# Altium schematic symbol library lib_datalogger.SchLib: 1246 symbols (part 6 of 16) (continued)
## CMP-008-000028-2 (continued)
LED GREEN CLEAR 3MM ROUND T/H; Manufacturer: Lumex Opto/Components Inc; MSRP: 0,32984; Number of LEDs: 1; Wavelength: 574nm; Luminous Intensity: 1000mcd; Lens Color: Colorless; eVendor: Digi-Key; Forward Current: 20mA; eVendor#: 67-2183-ND; Viewing Angle: 30°; Forward Voltage: 2.2V; eVendorPrice: 1,12; Lens Style: Dome,Diffused,Colorless,Round; Source: mits.SchLib; Mount: Through Hole; Series: -; Illumination Color: Green; Design Item ID: LED T-3 GRN 3MM 574NM WATER CLR 2LD; Obs: --; Part#: SSL-LX3044SUGC; Max Operating Temperature: 85°C; Height: 4.6mm; Packaging: Bulk; Min Operating Temperature: -40°C; Case/Package: Radial; MOQ: 10000; Datasheet: http://www.lumex.com/specs/SSL-LX3044SUGC.pdf; Color: Green; RoHS Compliant: Yes; Lens Transparency: Clear; Package Quantity: 1000; Test Current: 20mA; Number of Pins: 2
footprint LED-3mm-VERDE
footprint LED-3mm-VERDE
pins: A, K

## CMP-008-000029-1
designator D?, comment TVS DIODE 5.0SMDJ12CA 12VWM 19.9VC SMD
TVS DIODE 12VWM 19.9VC SMD; Manufacturer: Littelfuse Inc.; Current - Peak Pulse (10/1000µs): 252A; Power Line Protection: No; Type: Zener; Voltage - Clamping (Max) @ Ipp: 19.9V; Voltage - Reverse Standoff (Typ): 12V; Power - Peak Pulse: 5000W (5kW); Voltage - Breakdown (Min): 13.3V; Capacitance @ Frequency: -; ComponentLink1Description: http://www.littelfuse.com/products/tvs-diodes/surface-mount/~/media/electronics/datasheets/tvs_diodes/littelfuse_tvs_diode_5_0smdj_datasheet.pdf.pdf; ComponentLink1URL: http://www.littelfuse.com/products/tvs-diodes/surface-mount/~/media/electronics/datasheets/tvs_diodes/littelfuse_tvs_diode_5_0smdj_datasheet.pdf.pdf; Design Item ID: TVS DIODE 5.0SMDJ12CA 12VWM 19.9VC SMD; Packaging: Cut Tape (CT); Operating Temperature: -55°C ~ 150°C (TJ); Applications: General Purpose; Manufacturer Part Number: 5.0SMDJ12CA; Package / Case: DO-214AB, SMC; Supplier Device Package: DO-214AB (SMCJ); Part Status: Active; Mounting Type: Surface Mount; Source: mits.SchLib; RoHS: RoHS Compliant; Pricing 1: 1=1.85, 10=1.673, 25=1.4936, 100=1.3442, 250=1.1948, 500=1.04546, 1000=0.86623 (USD); Stock 1: 196; Category: Circuit Protection
footprint DO-214AB(SMC)
footprint DO-214AB(SMC)
pins: 1, 2

## CMP-008-000030-1
designator D?, comment TVS DIODE 5.0SMDJ28A 28VWM 45.4VC SMD
TVS DIODE 28VWM 45.4VC SMD; Manufacturer: Littelfuse Inc.; Voltage - Breakdown (Min): 31.1V; Current - Peak Pulse (10/1000µs): 110A; Type: Zener; Power - Peak Pulse: 5000W (5kW); Power Line Protection: No; Voltage - Reverse Standoff (Typ): 28V; Voltage - Clamping (Max) @ Ipp: 45.4V; Packaging: Cut Tape (CT); Part Status: Active; Operating Temperature: -55°C ~ 150°C (TJ); Source: mits.SchLib; Applications: General Purpose; Mounting Type: Surface Mount; ComponentLink1URL: http://www.littelfuse.com/products/tvs-diodes/surface-mount/~/media/electronics/datasheets/tvs_diodes/littelfuse_tvs_diode_5_0smdj_datasheet.pdf.pdf; Design Item ID: TVS DIODE 5.0SMDJ28A 28VWM 45.4VC SMD; Supplier Device Package: DO-214AB (SMCJ); Stock 1: 2911; Pricing 1: 1=1.72, 10=1.552, 25=1.3852, 100=1.2468, 250=1.10828, 500=0.96974, 1000=0.8035 (USD); Capacitance @ Frequency: -; Package / Case: DO-214AB, SMC; ComponentLink1Description: http://www.littelfuse.com/products/tvs-diodes/surface-mount/~/media/electronics/datasheets/tvs_diodes/littelfuse_tvs_diode_5_0smdj_datasheet.pdf.pdf; RoHS: RoHS Compliant; Manufacturer Part Number: 5.0SMDJ28A; Category: Circuit Protection
footprint DO-214AB(SMC)
footprint DO-214AB(SMC)
pins: 1 K, 2 A

## CMP-008-000031-1
designator D?, comment TVS DIODE 56VWLDP01-56AY M 76VC D2PAK SMD
TVS DIODE 56VWM 76VC D2PAK; Manufacturer: STMicroelectronics; Unidirectional Channels: 1; Power Line Protection: No; Voltage - Breakdown (Min): 53.3V; Current - Peak Pulse (10/1000µs): 48A; Voltage - Reverse Standoff (Typ): 48V; Voltage - Clamping (Max) @ Ipp: 76V; Type: Zener; Mounting Type: Surface Mount; Category: Circuit Protection; Stock 1: 1369; Power - Peak Pulse: -; Operating Temperature: -55°C ~ 175°C (TJ); ComponentLink1URL: http://www.st.com/web/en/resource/technical/document/datasheet/DM00122355.pdf; RoHS: RoHS Compliant; Part Status: Active; Design Item ID: TVS DIODE 56VWLDP01-56AY M 76VC D2PAK SMD; Package / Case: TO-263-3, D²Pak (2 Leads + Tab), TO-263AB; Bidirectional Channels: -; Capacitance @ Frequency: -; Source: mits.SchLib; Applications: Automotive; Packaging: Cut Tape (CT); Manufacturer Part Number: LDP01-56AY; Pricing 1: 1=2.52, 10=2.26, 100=1.8133, 500=1.4904 (USD); Supplier Device Package: D2PAK; ComponentLink1Description: http://www.st.com/web/en/resource/technical/document/datasheet/DM00122355.pdf
footprint TO263-3 (D²Pak (2 Leads + Tab))
footprint TO263-3 (D²Pak (2 Leads + Tab))
pins: 1 A, 2 K, 3 A

## CMP-008-000032-1
designator R?, comment TVS DIODE 5KP16CA 16VWM 26VC AXIAL TH
TVS DIODE 16VWM 26VC AXIAL; Manufacturer: Littelfuse Inc; eVendorPrice: 3,07; MSRP: 1,97968; eVendor#: 5KP16CALFCT-ND; eVendor: Digi-Key; Observações: --; Datasheet: http://www.littelfuse.com/~/media/electronics/datasheets/tvs_diodes/littelfuse_tvs_diode_5kp_datasheet.pdf.pdf; MOQ: 250; Design Item ID: TVS DIODE 5KP16CA 16VWM 26VC AXIAL TH; Part#: 5KP16CA; Source: mits.SchLib
footprint CR1608-0603 (Chip Resistor; Body 1.6 x 0.8 mm (LxW typ))
footprint R-6
pins: 1, 2
text: 1%

## CMP-008-000033-1
designator D?, comment TVS DIODE 5KP24A 24VWM 38.9VC AXIAL TH
TVS DIODE 24VWM 38.9VC AXIAL; Manufacturer: Littelfuse Inc; eVendor: Digi-Key; MSRP: 1,80044; Observações: Uni-directional; eVendor#: 5KP24ALFCT-ND; eVendorPrice: 2,79; Source: mits.SchLib; Design Item ID: TVS DIODE 5KP24A 24VWM 38.9VC AXIAL TH; MOQ: 250; Part#: 5KP24A; Datasheet: http://www.littelfuse.com/~/media/electronics/datasheets/tvs_diodes/littelfuse_tvs_diode_5kp_datasheet.pdf.pdf
footprint R-6
footprint R-6
pins: 1 K, 2 A

## CMP-008-000034-1
designator D?, comment TVS DIODE 5KP40CA 40VWM 64.5VC AXIAL TH
TVS DIODE 40VWM 64.5VC AXIAL TH; Manufacturer: Littelfuse Inc; eVendor#: 5KP40CALFTR-ND; MSRP: 1,97968; eVendor: Digi-Key; eVendorPrice: 3,07; Part#: 5KP40CA; MOQ: 250; Datasheet: http://www.littelfuse.com/~/media/electronics/datasheets/tvs_diodes/littelfuse_tvs_diode_5kp_datasheet.pdf.pdf; Design Item ID: TVS DIODE 5KP40CA 40VWM 64.5VC AXIAL TH; Observações: --; Source: mits.SchLib
footprint DO-214AB(SMC)
footprint R-6
pins: 1, 2

## CMP-008-000035-2
designator D?, comment ATV50C400JB-HF
Automotive Tvs Diode 40VWM 64.5VC DO214AB Smc; Manufacturer: Comchip Technology; Peak Pulse Power: 5kW; Peak Pulse Current: 77.5A; Number of Bidirectional Channels: 1; Clamping Voltage: 64.5V; Reverse Standoff Voltage: 40V; Power Line Protection: No; Min Breakdown Voltage: 44.4V; MSRP: 1,03555; eVendor: Digi-Key; eVendorPrice: 2,22; eVendor#: 641-1605-1-ND; MOQ: 1000; RoHS Compliant: Yes; Datasheet: http://www.comchiptech.com/cms/UserFiles/ATV50C-HF%20Series%20RevA.pdf; Source: mits.SchLib; Design Item ID: TVS DIODE ATV50C400JB-HF 40VWM 64.5VC SMC; Packaging: Tape and Reel; Package Quantity: 3000; Case/Package: SMC; Resistor Type: Zener; Observações: --; Max Operating Temperature: 150°C; Mount: Surface Mount; Min Operating Temperature: -55°C; Part#: ATV50C400JB-HF
footprint DO-214AB(SMC)
footprint DO-214AB(SMC)
pins: 1, 2

## CMP-008-000036-1
designator U?, comment TVS DIODE CM1216-08MR 3.3VWM 9VC 10MSOP
TVS DIODE 3.3VWM 9VC 10MSOP; Manufacturer: ON Semiconductor; Voltage - Reverse Standoff (Typ): 3.3V; Voltage - Breakdown (Min): 6V; Power Line Protection: Yes; Current - Peak Pulse (10/1000µs): 1A (8/20µs); Unidirectional Channels: 8; Voltage - Clamping (Max) @ Ipp: 9V (Typ); Applications: General Purpose; Stock 1: 3587; Design Item ID: TVS DIODE CM1216-08MR 3.3VWM 9VC 10MSOP; Power - Peak Pulse: -; Category: Circuit Protection; Operating Temperature: -40°C ~ 125°C (TJ); Bidirectional Channels: -; ComponentLink1Description: http://www.onsemi.com/pub_link/Collateral/CM1216-D.PDF; Mounting Type: Surface Mount; Package / Case: 10-TFSOP, 10-MSOP (0.118", 3.00mm Width); Source: mits.SchLib; RoHS: RoHS Compliant; Packaging: Cut Tape (CT); Type: Steering (Rail to Rail); Manufacturer Part Number: CM1216-08MR; Capacitance @ Frequency: -; Part Status: Active; Supplier Device Package: 10-MSOP; Pricing 1: 1=1.22, 10=1.094, 100=0.8526, 500=0.70434, 1000=0.55605 (USD); ComponentLink1URL: http://www.onsemi.com/pub_link/Collateral/CM1216-D.PDF
footprint TSSOP10
footprint TSSOP10
pins: 1 I/O 1, 2 I/O 2, 3 I/O 3, 4 I/O 4, 5 GND (power), 6 I/O 5, 7 I/O 6, 8 VCC, 9 I/O 7, 10 I/O 8

## CMP-008-000037-1
designator U?, comment TVS DIODE PRTR5V0U2X,215 5.5VWM SOT143B_1
TVS DIODE 5.5VWM SOT143B; Manufacturer: NXP Semiconductors; MSRP: 0,20265; eVendorPrice: 0,57; eVendor#: 568-4140-1-ND; eVendor: Digi-Key; Design Item ID: TVS DIODE PRTR5V0U2X,215 5.5VWM SOT143B_1; Datasheet: http://www.nxp.com/documents/data_sheet/PRTR5V0U2X.pdf; MOQ: 1000; Source: mits.SchLib; Part#: PRTR5V0U2X,215
footprint SOT143B
footprint SOT143B
pins: 1 GND (power), 2 I/O 1 (io), 3 I/O 2 (io), 4 VCC (power)

## CMP-008-000038-1
designator U?, comment TVS DIODE PRTR5V0U8S,118 5.5VWM 10TSSOP SMD
TVS DIODE 5.5VWM 10TSSOP; Manufacturer: NXP USA Inc.; Voltage - Breakdown (Min): 6V; Voltage - Reverse Standoff (Typ): 5.5V (Max); Capacitance @ Frequency: 1pF @ 1MHz; Power Line Protection: Yes; Unidirectional Channels: 8; Power - Peak Pulse: -; Source: mits.SchLib; Package / Case: 10-TFSOP, 10-MSOP (0.118", 3.00mm Width); ComponentLink1URL: http://www.nxp.com/documents/data_sheet/PRTR5V0U8S.pdf; Mounting Type: Surface Mount; RoHS: RoHS Compliant; Supplier Device Package: 10-TSSOP; Stock 1: 0; Category: Circuit Protection; Voltage - Clamping (Max) @ Ipp: -; Design Item ID: TVS DIODE PRTR5V0U8S,118 5.5VWM 10TSSOP SMD; Packaging: Cut Tape (CT); Bidirectional Channels: -; Manufacturer Part Number: PRTR5V0U8S,118; Part Status: Obsolete; Pricing 1: 1=0 (USD); Applications: General Purpose; Type: Steering (Rail to Rail); Operating Temperature: -40°C ~ 85°C (TA); Current - Peak Pulse (10/1000µs): -; ComponentLink1Description: http://www.nxp.com/documents/data_sheet/PRTR5V0U8S.pdf
footprint TSSOP10
footprint TSSOP10
pins: 1 I/O 1, 2 I/O 2, 3 GND, 4 I/O 3, 5 I/O 4, 6 I/O 5, 7 I/O 6, 8 VCC, 9 I/O 7, 10 I/O 8

## CMP-008-000039-1
designator D?, comment TVS DIODE SACB12 12VWM 19VC SMD
TVS DIODE 12VWM 19VC SMD; Manufacturer: Littelfuse Inc; eVendorPrice: 0,72; MSRP: 0,25725; eVendor: Digi-Key; eVendor#: SACB12CT-ND; Source: mits.SchLib; MOQ: 1000; Observações: --; Datasheet: http://www.littelfuse.com/~/media/electronics/datasheets/tvs_diodes/littelfuse_tvs_diode_sacb_datasheet.pdf.pdf; Design Item ID: TVS DIODE SACB12 12VWM 19VC SMD; Part#: SACB12
footprint DO-214AA(SMB)
footprint DO-214AA(SMB)-6
pins: 1 K, 2 A

## CMP-008-000040-1
designator U?, comment TVS DIODE SLVU2.8 2.8VWM 15VC 8SOIC
TVS DIODE 2.8VWM 15VC 8SOIC; Manufacturer Part Number: SLVU2.8-4BTG; Manufacturer: Littelfuse Inc.; Power Line Protection: No; Current - Peak Pulse (10/1000µs): 40A (8/20µs); Voltage - Reverse Standoff (Typ): 2.8V (Max); Voltage - Breakdown (Min): 3V; Power - Peak Pulse: 600W; Voltage - Clamping (Max) @ Ipp: 15V; Capacitance @ Frequency: 2pF @ 1MHz; Pricing 1: 1=1.98, 10=1.788, 25=1.5964, 100=1.4369, 250=1.2772, 500=1.11756, 1000=0.92597 (USD); Type: Zener; Supplier Device Package: 8-SOIC; ComponentLink1URL: http://www.littelfuse.com/~/media/electronics/datasheets/tvs_diode_arrays/littelfuse_tvs_diode_array_slvu2_8_4_datasheet.pdf.pdf; Part Status: Active; Packaging: Cut Tape (CT); Operating Temperature: -40°C ~ 125°C (TJ); RoHS: RoHS Compliant; Mounting Type: Surface Mount; Source: mits.SchLib; Applications: General Purpose; ComponentLink1Description: http://www.littelfuse.com/~/media/electronics/datasheets/tvs_diode_arrays/littelfuse_tvs_diode_array_slvu2_8_4_datasheet.pdf.pdf; Stock 1: 7453; Design Item ID: TVS DIODE SLVU2.8 2.8VWM 15VC 8SOIC; Package / Case: 8-SOIC (0.154", 3.90mm Width); Category: Circuit Protection
footprint SOIC-8
footprint SOIC-8
pins: 1 (io), 2 (io), 3 (io), 4 (io), 5 (io), 6 (io), 7 (io), 8 (io)

## CMP-008-000041-2
designator D?, comment TVS DIODE SLVU2.8 2.8VWM 15VC SOT23
TVS DIODE 2.8VWM 15VC SOT23; Manufacturer: Littelfuse Inc; Part#: SLVU2.8HTG; eVendorPrice: 1,08; eVendor#: F4207CT-ND; MSRP: 0,465; eVendor: Digi-Key; MOQ: 1000; Source: mits.SchLib; Datasheet: http://www.littelfuse.com/~/media/electronics/datasheets/tvs_diode_arrays/littelfuse_tvs_diode_array_slvu2_8_datasheet.pdf.pdf; Observações: --; Design Item ID: TVS DIODE SLVU2.8 2.8VWM 15VC SOT23
footprint SOT-23
footprint SOT-23
pins: 1, 2, 3

## CMP-008-000042-1
designator D?, comment TVS DIODE SM2T3V3A 3.3VWM 6.8VC DO216AA SMD
TVS DIODE 3.3VWM 6.8VC DO216AA; Manufacturer: STMicroelectronics; Type: Zener; Power - Peak Pulse: 200W; Capacitance @ Frequency: 2500pF @ 1MHz; Voltage - Breakdown (Min): 3.6V; Voltage - Reverse Standoff (Typ): 3.3V; Unidirectional Channels: 1; Voltage - Clamping (Max) @ Ipp: 6.8V; Power Line Protection: No; Current - Peak Pulse (10/1000µs): 30A; ComponentLink1URL: http://www.st.com/web/en/resource/technical/document/datasheet/CD00070945.pdf; Pricing 1: 1=0.61, 10=0.537, 100=0.4108, 500=0.32548, 1000=0.2607 (USD); Package / Case: DO-216AA; Operating Temperature: -; Stock 1: 29699; Supplier Device Package: DO-216AA; Manufacturer Part Number: SM2T3V3A; Category: Circuit Protection; Design Item ID: TVS DIODE SM2T3V3A 3.3VWM 6.8VC DO216AA SMD; Bidirectional Channels: -; RoHS: RoHS Compliant; Packaging: Cut Tape (CT); ComponentLink1Description: http://www.st.com/web/en/resource/technical/document/datasheet/CD00070945.pdf; Source: mits.SchLib; Applications: General Purpose; Mounting Type: Surface Mount
footprint DO-216AA
footprint DO-216AA
pins: 1 A, 2 K

## CMP-008-000043-1
designator D?, comment TVS DIODE SMBJ12CA 12VWM 19.9VC SMB SMD
TVS DIODE 12VWM 19.9VC SMB; Manufacturer: Micro Commercial Co; Manufacturer Part Number: SMBJ12CA-TP; Voltage - Clamping (Max) @ Ipp: 19.9V; Type: Zener; Power - Peak Pulse: 600W; Power Line Protection: No; Current - Peak Pulse (10/1000µs): 30.2A; Voltage - Reverse Standoff (Typ): 12V; Voltage - Breakdown (Min): 13.3V; Capacitance @ Frequency: -; Applications: General Purpose; Part Status: Active; ComponentLink1URL: http://www.mccsemi.com/up_pdf/SMBJ5.0-SMBJ440CA(DO-214AA).pdf; Operating Temperature: -55°C ~ 175°C (TJ); ComponentLink1Description: http://www.mccsemi.com/up_pdf/SMBJ5.0-SMBJ440CA(DO-214AA).pdf; Packaging: Cut Tape (CT); Stock 1: 2379; Category: Circuit Protection; Supplier Device Package: DO-214AA (SMB); Design Item ID: TVS DIODE SMBJ12CA 12VWM 19.9VC SMB SMD; Mounting Type: Surface Mount; RoHS: RoHS Compliant; Package / Case: DO-214AA, SMB; Source: mits.SchLib; Pricing 1: 1=0.54, 10=0.38, 25=0.3116, 100=0.2493, 250=0.18128, 500=0.1473, 1000=0.1133 (USD)
footprint DO-214AA(SMB)
footprint DO-214AA(SMB)-6
pins: 1 A, 2 K

## CMP-008-000044-1
designator D?, comment TVS DIODE SMBJ15A 15VWM 24.4VC SMB
TVS DIODE 15VWM 24.4VC SMB; Manufacturer: Vishay Semiconductor Diodes Division; Manufacturer Part Number: SMBJ15A-E3/52; Power Line Protection: No; Current - Peak Pulse (10/1000µs): 24.6A; Unidirectional Channels: 1; Voltage - Reverse Standoff (Typ): 15V; Voltage - Breakdown (Min): 16.7V; Power - Peak Pulse: 600W; Type: Zener; Voltage - Clamping (Max) @ Ipp: 24.4V; Source: mits.SchLib; Applications: General Purpose; Supplier Device Package: DO-214AA (SMBJ); Packaging: Cut Tape (CT); Category: Circuit Protection; Operating Temperature: -55°C ~ 150°C (TJ); Bidirectional Channels: -; Stock 1: 0; Package / Case: DO-214AA, SMB; RoHS: RoHS Compliant; Mounting Type: Surface Mount; Pricing 1: 1=0.44, 10=0.333, 100=0.2078 (USD); ComponentLink1URL: http://www.vishay.com/docs/88392/smbj50a.pdf; Capacitance @ Frequency: -; Design Item ID: TVS DIODE SMBJ15A 15VWM 24.4VC SMB; ComponentLink1Description: http://www.vishay.com/docs/88392/smbj50a.pdf
footprint DO-214AA(SMB)
footprint DO-214AA(SMB)-6
pins: 1 A, 2 K

## CMP-008-000045-1
designator D?, comment TVS DIODE SMBJ15CA 15VWM 24.4VC SMB SMD
TVS DIODE 15VWM 24.4VC SMB; Manufacturer Part Number: SMBJ15CA-E3/52; Manufacturer: Vishay Semiconductor Diodes Division; Power Line Protection: No; Voltage - Breakdown (Min): 16.7V; Voltage - Reverse Standoff (Typ): 15V; Type: Zener; Current - Peak Pulse (10/1000µs): 24.6A; Power - Peak Pulse: 600W; Voltage - Clamping (Max) @ Ipp: 24.4V; ComponentLink1URL: http://www.vishay.com/docs/88392/smbj50a.pdf; Stock 1: 3382; Part Status: Active; Mounting Type: Surface Mount; Source: mits.SchLib; Applications: General Purpose; Category: Circuit Protection; Package / Case: DO-214AA, SMB; Operating Temperature: -55°C ~ 150°C (TJ); Supplier Device Package: DO-214AA (SMBJ); Pricing 1: 1=0.41, 10=0.329, 25=0.3012, 100=0.2241, 250=0.20312 (USD); RoHS: RoHS Compliant; Design Item ID: TVS DIODE SMBJ15CA 15VWM 24.4VC SMB SMD; Packaging: Cut Tape (CT); Capacitance @ Frequency: -; ComponentLink1Description: http://www.vishay.com/docs/88392/smbj50a.pdf
footprint DO-214AA(SMB)
footprint DO-214AA(SMB)-6
pins: 1 A, 2 K

## CMP-008-000046-1
designator D?, comment TVS DIODE SMBJ20A 20VWM 32.4VC SMB
TVS DIODE 20V 32.4V DO214AA; Manufacturer: Littelfuse; Power Dissipation: 600W; Peak Pulse Current: 18.6A; Polarity: Unidirectional; Diode Type: ZENER; Number of Channels: 1; Max Breakdown Voltage: 24.5V; Breakdown Voltage: 22.2V; Power Line Protection: No; Test Current: 1mA; Leakage Current: 1uA; ComponentLink3Description: https://datasheet.ciiva.com/331/littelfuse-tvs-diode-smbj-datasheet-pdf-331294.pdf?src-supplier=Digi-Key; Voltage Rating (DC): 20V; Reverse Standoff Voltage: 20V; Max Operating Temperature: 150°C; Resistor Type: Zener; Max Surge Current: 18.6A; Category: TVS Diodes; Number of Elements: 1; ComponentLink2Description: https://datasheet.ciiva.com/331/littelfuse-tvs-diode-smbj-datasheet-pdf-331293.pdf?src-supplier=Digi-Key; Mount: Surface Mount; Max Power Dissipation: 600W; Number of Pins: 2; Case/Package: DO-214AA; ComponentLink4Description: https://datasheet.ciiva.com/331/littelfuse-tvs-diode-smbj-datasheet-pdf-331295.pdf?src-supplier=Digi-Key; RoHS Compliant: Yes; ComponentLink1Description: http://www.vishay.com/docs/88392/smbj50a.pdf; Design Item ID: TVS DIODE SMBJ20A 20VWM 32.4VC SMB; Operating Supply Voltage: 20V; Lead Free: Lead Free; ComponentLink2URL: https://datasheet.ciiva.com/331/littelfuse-tvs-diode-smbj-datasheet-pdf-331293.pdf?src-supplier=Digi-Key; Min Breakdown Voltage: 22.2V; ComponentLink3URL: https://datasheet.ciiva.com/331/littelfuse-tvs-diode-smbj-datasheet-pdf-331294.pdf?src-supplier=Digi-Key; Package Quantity: 3000; Height: 2.44mm; Stock 1: 45; Width: 3.94mm; Manufacturer Part Number: SMBJ20A; RoHS: Yes; Pricing 1: 5=0,15360, 50=0,11800, 150=0,11150, 500=0,10500, 2500=0,10210, 5000=0,10060, 5=0,14700, 50=0,11290, 150=0,10680, 500=0,10050, 2500=0,09770, 5000=0,09630, 5=0,76770, 50=0,58980, 150=0,55760, 500=0,52470, 2500=0,51030, 5000=0,50310, 5=0,73940, 50=0,56800, 150=0,53700, 500=0,50540, 2500=0,49150, 5000=0,48450, 5=0,09940, 50=0,07640, 150=0,07220, 500=0,06790, 2500=0,06610, 5000=0,06510, 5=0,08450, 50=0,06490, 150=0,06140, 500=0,05780, 2500=0,05620, 5000=0,05540, 5=0,90900, 50=0,69830, 150=0,66020, 500=0,62130, 2500=0,60420, 5000=0,59560, 5=12,94150, 50=9,94140, 150=9,39890, 500=8,84540, 2500=8,60180, 5000=8,48000, 5=0,48400, 50=0,37180, 150=0,35150, 500=0,33080, 2500=0,32170, 5000=0,31720, 5=8,93530, 50=6,86390, 150=6,48940, 500=6,10720, 2500=5,93910, 5000=5,85500, 5=1,01980, 50=0,78340, 150=0,74060, 500=0,69700, 2500=0,67780, 5000=0,66820, 5=0,15730, 50=0,12080, 150=0,11420, 500=0,10750, 2500=0,10460, 5000=0,10310, 5=0,11690, 50=0,08980, 150=0,08490, 500=0,07990, 2500=0,07770, 5000=0,07660 (AUD); Clamping Voltage-Max: 32.4V; Series: SMBJ; ComponentLink5Description: https://datasheet.ciiva.com/4509/littelfuse-tvs-diode-smbj-48653-4509407.pdf?src-supplier=Mouser; ComponentLink7Description: https://datasheet.ciiva.com/46381/607623-46381901.pdf?src-supplier=Element14; Length: 5.59mm; REACH SVHC: No SVHC; ComponentLink6Description: https://datasheet.ciiva.com/16391/littelfuse-tvs-diode-smbj-16391319.pdf?src-supplier=Future+Electronics; ComponentLink1URL: http://www.vishay.com/docs/88392/smbj50a.pdf; Reverse Breakdown Voltage: 22.2V; Packaging: Tape and Reel; Radiation Hardening: No; Peak Pulse Power: 600W; ComponentLink5URL: https://datasheet.ciiva.com/4509/littelfuse-tvs-diode-smbj-48653-4509407.pdf?src-supplier=Mouser; Clamping Voltage: 32.4V; Termination: SMD/SMT; ComponentLink4URL: https://datasheet.ciiva.com/331/littelfuse-tvs-diode-smbj-datasheet-pdf-331295.pdf?src-supplier=Digi-Key; Min Operating Temperature: -55°C; Number of Unidirectional Channels: 1; ComponentLink7URL: https://datasheet.ciiva.com/46381/607623-46381901.pdf?src-supplier=Element14; Source: mits.SchLib; ComponentLink6URL: https://datasheet.ciiva.com/16391/littelfuse-tvs-diode-smbj-16391319.pdf?src-supplier=Future+Electronics; Direction: Unidirectional
footprint DO-214AA(SMB)
footprint DO-214AA(SMB)-6
pins: 1 A, 2 K

## CMP-008-000047-1
designator D?, comment TVS DIODE SMBJP6KE6.8CA 5.8VWM 10.5VC SMBJ SMD
TVS DIODE 5.8VWM 10.5VC SMBJ; Manufacturer: Micro Commercial Co; Manufacturer Part Number: SMBJP6KE6.8CA-TP; Current - Peak Pulse (10/1000µs): 58.1A; Power - Peak Pulse: 600W; Power Line Protection: No; Voltage - Breakdown (Min): 6.45V; Voltage - Reverse Standoff (Typ): 5.8V; Type: Zener; Voltage - Clamping (Max) @ Ipp: 10.5V; Operating Temperature: -55°C ~ 175°C (TJ); ComponentLink1Description: http://www.mccsemi.com/up_pdf/SMBJP6KE6.8(C)A-SMBJP6KE550(C)A(DO-214AA).pdf; Package / Case: DO-214AA, SMB; Packaging: Cut Tape (CT); Applications: General Purpose; ComponentLink1URL: http://www.mccsemi.com/up_pdf/SMBJP6KE6.8(C)A-SMBJP6KE550(C)A(DO-214AA).pdf; Stock 1: 18765; Pricing 1: 1=0.44, 10=0.341, 25=0.288, 100=0.2343, 250=0.19416, 500=0.16068, 1000=0.12051 (USD); Source: mits.SchLib; Supplier Device Package: DO-214AA (SMBJ); Capacitance @ Frequency: -; RoHS: RoHS Compliant; Part Status: Active; Category: Circuit Protection; Design Item ID: TVS DIODE SMBJP6KE6.8CA 5.8VWM 10.5VC SMBJ SMD; Mounting Type: Surface Mount
footprint DO-214AA(SMB)
footprint DO-214AA(SMB)-6
pins: 1 A, 2 K

## CMP-008-000048-1
designator D?, comment TVS DIODE SMCJ1.5KE20A-TP 17.1VWM 27.7VC SMC SMD
TVS DIODE 17.1VWM 27.7VC SMC; Manufacturer: Micro Commercial Co; Power Line Protection: No; Power - Peak Pulse: 1500W (1.5kW); Voltage - Breakdown (Min): 19V; Current - Peak Pulse (10/1000µs): 54.9A; Voltage - Clamping (Max) @ Ipp: 27.7V; Type: Zener; Voltage - Reverse Standoff (Typ): 17.1V; Unidirectional Channels: 1; RoHS: RoHS Compliant; Capacitance @ Frequency: -; Bidirectional Channels: -; Manufacturer Part Number: SMCJ1.5KE20A-TP; Part Status: Active; Design Item ID: TVS DIODE SMCJ1.5KE20A-TP 17.1VWM 27.7VC SMC SMD; Category: Circuit Protection; ComponentLink1Description: http://www.mccsemi.com/up_pdf/SMCJ1.5KE6.8(C)A-SMCJ1.5KE550(C)A(DO-214AB).pdf; Applications: General Purpose; Package / Case: DO-214AB, SMC; ComponentLink1URL: http://www.mccsemi.com/up_pdf/SMCJ1.5KE6.8(C)A-SMCJ1.5KE550(C)A(DO-214AB).pdf; Operating Temperature: -55°C ~ 175°C (TJ); Pricing 1: 1=0.68, 10=0.569, 25=0.4976, 100=0.4264, 250=0.36956, 500=0.3127, 1000=0.24164 (USD); Packaging: Cut Tape (CT); Stock 1: 8753; Supplier Device Package: DO-214AB, (SMC); Source: mits.SchLib; Mounting Type: Surface Mount
footprint DO-214AB(SMC) / R-6
footprint DO-214AB(SMC)
footprint DO-214AB(SMC)
footprint DO-214AB(SMC) %2F R-6
pins: 1 K, 2 A

## CMP-008-000049-1
designator U?, comment TVS DIODE SP3304N 3.3VWM 11.5VC UDFN10
TVS DIODE 3.3VWM 11.5VC UDFN10; Manufacturer Part Number: SP3304NUTG; Manufacturer: Littelfuse Inc.; Power Line Protection: Yes; Voltage - Reverse Standoff (Typ): 3.3V (Max); Voltage - Clamping (Max) @ Ipp: 11.5V; Current - Peak Pulse (10/1000µs): 20A (8/20µs); Power - Peak Pulse: 300W; Package / Case: 10-UFDFN Exposed Pad; Source: mits.SchLib; Capacitance @ Frequency: -; Operating Temperature: -40°C ~ 125°C (TJ); Pricing 1: 1=1.69, 10=1.501, 25=1.3556, 100=1.186, 250=1.0408, 500=0.9198, 1000=0.72615 (USD); RoHS: RoHS Compliant; Design Item ID: TVS DIODE SP3304N 3.3VWM 11.5VC UDFN10; Type: Steering (Rail to Rail); ComponentLink1URL: http://www.littelfuse.com/~/media/electronics/datasheets/tvs_diode_arrays/littelfuse_tvs_diode_array_sp3304n_datasheet.pdf.pdf; ComponentLink1Description: http://www.littelfuse.com/~/media/electronics/datasheets/tvs_diode_arrays/littelfuse_tvs_diode_array_sp3304n_datasheet.pdf.pdf; Voltage - Breakdown (Min): -; Stock 1: 2111; Part Status: Active; Category: Circuit Protection; Applications: Ethernet; Supplier Device Package: 10-uDFN (2.6x2.6); Mounting Type: Surface Mount; Packaging: Cut Tape (CT)
footprint 10-UDFN
footprint 10-UDFN
pins: 1 I/O1 (io), 3 I/O2 (io), 5 NC, 7 I/O3 (io), 9 I/O4 (io), E GND (power)

## CMP-008-000050-1
designator U?, comment TVS DIODE SRDA05-6 5VWM 20VC 8SOIC_1
TVS DIODE 5VWM 20VC 8SOIC; Manufacturer: Semtech Corporation; Manufacturer Part Number: SRDA05-6.TBT; Voltage - Reverse Standoff (Typ): 5V (Max); Voltage - Clamping (Max) @ Ipp: 20V; Power - Peak Pulse: 500W; Voltage - Breakdown (Min): 6V; Power Line Protection: Yes; Current - Peak Pulse (10/1000µs): 25A (8/20µs); Capacitance @ Frequency: 8pF @ 1MHz; Packaging: Cut Tape (CT); Package / Case: 8-SOIC (0.154", 3.90mm Width); Mounting Type: Surface Mount; Supplier Device Package: 8-SO; Design Item ID: TVS DIODE SRDA05-6 5VWM 20VC 8SOIC_1; Category: Circuit Protection; Pricing 1: 1=3, 10=2.678, 25=2.4096, 100=2.1956, 250=1.98136 (USD); Applications: General Purpose; ComponentLink1Description: http://www.semtech.com/images/datasheet/srda-6.pdf; ComponentLink1URL: http://www.semtech.com/images/datasheet/srda-6.pdf; Stock 1: 1121; Source: mits.SchLib; Operating Temperature: -55°C ~ 125°C (TJ); Type: Steering (Rail to Rail); RoHS: RoHS Compliant; Part Status: Active
footprint SOIC-8
footprint SOIC-8
pins: 1 I/O1 (io), 2 I/O2 (io), 3 VREF, 4 I/O3 (io), 5 I/O4 (io), 6 I/O5 (io), 7 I/O6 (io), 8 GND (power)

## CMP-008-000051-1
designator U?, comment TVS DIODE SRDA05-6 5VWM 20VC 8SOIC
TVS DIODE 5VWM 20VC 8SOIC; Manufacturer: Semtech Corporation; Manufacturer Part Number: SRDA05-6.TBT; Voltage - Breakdown (Min): 6V; Power - Peak Pulse: 500W; Power Line Protection: Yes; Capacitance @ Frequency: 8pF @ 1MHz; Current - Peak Pulse (10/1000µs): 25A (8/20µs); Voltage - Clamping (Max) @ Ipp: 20V; Voltage - Reverse Standoff (Typ): 5V (Max); Applications: General Purpose; Category: Circuit Protection; Operating Temperature: -55°C ~ 125°C (TJ); Stock 1: 1121; Supplier Device Package: 8-SO; Type: Steering (Rail to Rail); Part Status: Active; ComponentLink1URL: http://www.semtech.com/images/datasheet/srda-6.pdf; Source: mits.SchLib; Pricing 1: 1=3, 10=2.678, 25=2.4096, 100=2.1956, 250=1.98136 (USD); Mounting Type: Surface Mount; Design Item ID: TVS DIODE SRDA05-6 5VWM 20VC 8SOIC; ComponentLink1Description: http://www.semtech.com/images/datasheet/srda-6.pdf; Packaging: Cut Tape (CT); RoHS: RoHS Compliant; Package / Case: 8-SOIC (0.154", 3.90mm Width)
footprint SOIC-8
footprint SOIC-8
pins: 1 I/O1 (io), 2 I/O2 (io), 3 VREF, 4 I/O3 (io), 5 I/O4 (io), 6 I/O5 (io), 7 I/O6 (io), 8 GND (power)

## CMP-008-000052-1
designator U?, comment TVS DIODE TVS3V3L4U 3.3VWM 7.7VC SC74
TVS DIODE 3.3VWM 7.7VC SC74; Manufacturer Part Number: GS1M-LTP; Manufacturer: Infineon Technologies; Part#: TVS3V3L4U E6327; Voltage - DC Reverse (Vr) (Max): 1000V (1kV); Diode Type: Standard; Voltage - Forward (Vf) (Max) @ If: 1V @ 1A; eVendor#: TVS3V3L4U E6327CT-ND; Current - Average Rectified (Io): 1A; Speed: Standard Recovery >500ns, > 200mA (Io); Current - Reverse Leakage @ Vr: 10µA @ 1000V; eVendor: Digi-Key; Capacitance @ Vr, F: 15pF @ 4V, 1MHz; eVendorPrice: 0,90; MSRP: 0,35871; Pricing 1: 1=0.28, 10=0.258, 25=0.1856, 100=0.1442, 250=0.0906, 500=0.0772, 1000=0.0526, 2500=0.0474 (USD); Mounting Type: Surface Mount; Datasheet: http://www.infineon.com/dgdl/TVS3V3L4U_rev_2_2.pdf?folderId=db3a30431f848401011fcbf2ab4c04c4&fileId=db3a3043382e837301385be7912532ed; Design Item ID: TVS DIODE TVS3V3L4U 3.3VWM 7.7VC SC74; Category: Discrete Semiconductor Products; Reverse Recovery Time (trr): -; Source: mits.SchLib; RoHS: RoHS Compliant; ComponentLink1Description: http://www.mccsemi.com/up_pdf/GS1A-L~GS1M-L(DO-214AC).pdf; Operating Temperature - Junction: -55°C ~ 150°C; Package / Case: DO-214AC, SMA; Supplier Device Package: DO-214AC (SMA); Packaging: Cut Tape (CT); MOQ: 1000; Observações: -; Stock 1: 49379; ComponentLink1URL: http://www.mccsemi.com/up_pdf/GS1A-L~GS1M-L(DO-214AC).pdf
footprint SC74, SOT-457
footprint SC74, SOT-457
pins: 1 I/O1 (io), 2 GND (power), 3 I/O2 (io), 4 I/O3 (io), 5 NC, 6 I/O4 (io)

## CMP-008-000053-1
designator D?, comment TVS DIODE VESD05B1-02VHG3-08 5VWM 9.5VC SOD523
ESD Suppressor TVS Uni-Directional 30kV Automotive 2-Pin SOD-523 T/R; Manufacturer: Vishay; Source: mits.SchLib; Pricing 1: 1=0,40000, 10=0,29900, 100=0,16940, 500=0,11220, 1000=0,08602, 2000=0,07480 (USD); Manufacturer Part Number: VESD05B1-02VHG3-08; RoHS: No; Category: TVS Diodes; Design Item ID: TVS DIODE VESD05B1-02VHG3-08 5VWM 9.5VC SOD523
footprint SOD-523
footprint SOD-523
pins: 1 A, 2 K

## CMP-009-000000-1
designator FL?, comment MLPF-WB55-01E3
Filter; Manufacturer 1: STMicroelectronics; Arrow Price/Stock: https://www.arrow.com/en/products/mlpf-wb55-01e3/stmicroelectronics; Manufacturer Part Number 1: MLPF-WB55-01E3; Source: mits.SchLib; Datasheet Link: https://www.st.com/resource/en/datasheet/mlpf-wb55-01e3.pdf; Design Item ID: MLPF-WB55-01E3; Height: 0.7mm; Arrow Part Number: MLPF-WB55-01E3; Mouser Price/Stock: https://www.mouser.co.uk/ProductDetail/STMicroelectronics/MLPF-WB55-01E3?qs=vLWxofP3U2xV%2FkxL9PmCDA%3D%3D
footprint MLPFWB5501E3
footprint MLPFWB5501E3
pins: 1 OUT, 2 GND4, 3 IN, 4 GND1, 5 GND2, 6 GND3

## CMP-009-00000-6
designator R?, comment Resistor 51k +/-5% 0402 63 mW  value 51k  Power: 63mW  Case/Package: 0402  Max Operating Temperature: 155°C  Mounting Technology: SM  Tolerance: 5%  Min Operating Temperature: -55°C  Pins: 2  RoHS Compliant: True
Chip Resistor, 51 KOhm, +/- 5%, 0.063 W, -55 to 155 degC, 0402 (1005 Metric)
footprint RESC1005X40X25LL05T10 (Chip Resistor, 2-Leads, Body 1.05x0.55mm, IPC High Density)
footprint RESC1005X40X25ML05T10 (Chip Resistor, 2-Leads, Body 1.05x0.55mm, IPC Low Density)
footprint RESC1005X40X25NL05T10 (Chip Resistor, 2-Leads, Body 1.05x0.55mm, IPC Medium Density)
pins: 1, 2

## CMP-00009-1
designator R?, comment RES 2.2K OHM 1/8W 1% AXIAL  RoHS Compliant: No  Max Operating Temperature: 175°C  Packaging: Tape and Reel  Resistance: 2.2kR  Min Operating Temperature: -65°C  Case/Package: Axial  Voltage Rating: 200V  Tolerance: 1%  Package Quantity: 1000  Diameter: 2.29mm
Temperature Coefficient: 100ppm/°C; Max Power Dissipation: 125mW; Lead Diameter: 0.64mm; Width: 2.29mm; Resistor Type: Metal Film; Number of Terminations: 2; Termination: Axial; Military Standard: MIL-R-10509; Length: 0.24inch; Series: Military, MIL-R-10509/7, RN55; Features: Moisture Resistant,Military,Flame Retardant Coating; Lead Free: Contains Lead; Mount: Through Hole; Contact Plating: Tin,Lead; Power Rating: 125mW
footprint RESA60-630X240-2 (Axial Resistor, 2-Leads, Dia 2.4mm, Body Length 6.3mm)
pins: 1, 2

## CMP-009-00001-6
designator R?, comment Resistor 0R +/- 1% 0805 125 mW  value 0  Case/Package: 0805  Power: 125mW  Voltage Rating: 150V  Tolerance: 1%  Pins: 2  Mounting Technology: SM  Max Operating Temperature: 155°C  Min Operating Temperature: -55°C  RoHS Compliant: True
Chip Resistor, 0 Ohm, +/- 1%, 125 mW, -55 to 155 degC, 0805 (2012 Metric)
footprint RESC2013X50X35ML15T15 (Chip Resistor, 2-Leads, Body 2.2x1.4mm, IPC Low Density)
footprint RESC2013X50X35LL15T15 (Chip Resistor, 2-Leads, Body 2.2x1.4mm, IPC High Density)
footprint RESC2013X50X35NL15T15 (Chip Resistor, 2-Leads, Body 2.2x1.4mm, IPC Medium Density)
pins: 1, 2

## CMP-009-00002-6
designator R?, comment Resistor 0R +/- 5% 1206 250 mW  value 0  RoHS Compliant: True  Pins: 2  Case/Package: 1206  Power: 250mW  Min Operating Temperature: -55°C  Mounting Technology: SM  Voltage Rating: 200V  Tolerance: 5%  Max Operating Temperature: 155°C
Chip Resistor, 0 Ohm, +/- 5%, 0.25 W, -55 to 155 degC, 1206 (3216 Metric)
footprint RESC3216X60X45NL15T20 (Chip Resistor, 2-Leads, Body 3.3x1.75mm, IPC Medium Density)
footprint RESC3216X60X45ML15T20 (Chip Resistor, 2-Leads, Body 3.3x1.75mm, IPC Low Density)
footprint RESC3216X60X45LL15T20 (Chip Resistor, 2-Leads, Body 3.3x1.75mm, IPC High Density)
pins: 1, 2

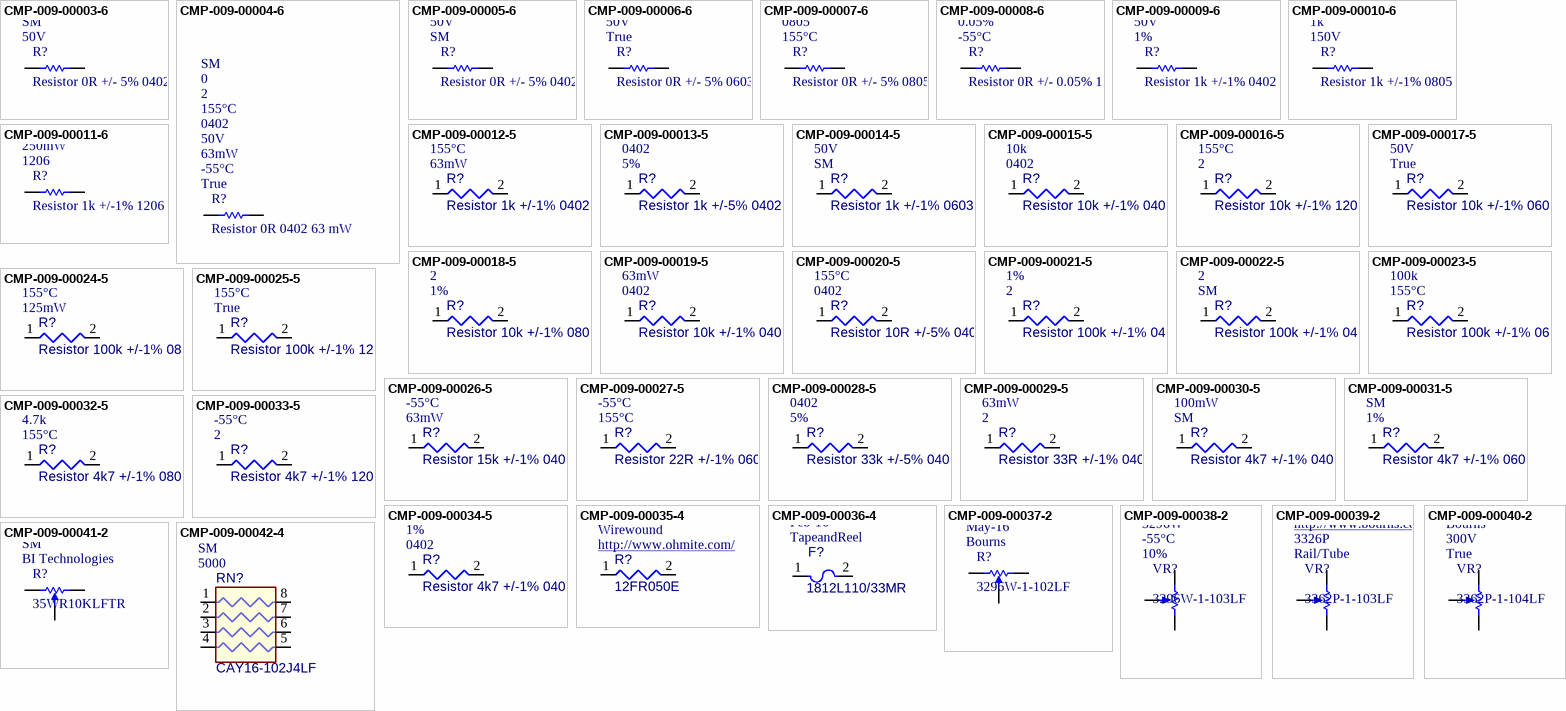
[diagram p17: symbols CMP-009-00003-6 to CMP-009-00042-4]

## CMP-009-00003-6
designator R?, comment Resistor 0R +/- 5% 0402 63 mW  value 0  Voltage Rating: 50V  Mounting Technology: SM  Max Operating Temperature: 155°C  Tolerance: 5%  RoHS Compliant: True  Power: 63mW  Case/Package: 0402  Pins: 2  Min Operating Temperature: -55°C
Chip Resistor, 0 Ohm, +/- 5%, 63 mW, -55 to 155 degC, 0402 (1005 Metric)
footprint RESC1005X40X25NL05T05 (Chip Resistor, 2-Leads, Body 1.05x0.55mm, IPC Medium Density)
footprint RESC1005X40X25ML05T05 (Chip Resistor, 2-Leads, Body 1.05x0.55mm, IPC Low Density)
footprint RESC1005X40X25LL05T05 (Chip Resistor, 2-Leads, Body 1.05x0.55mm, IPC High Density)
pins: 1, 2

## CMP-009-00004-6
designator R?, comment Resistor 0R 0402 63 mW  value 0  RoHS Compliant: True  Min Operating Temperature: -55°C  Power: 63mW  Voltage Rating: 50V  Case/Package: 0402  Max Operating Temperature: 155°C  Pins: 2  Mounting Technology: SM
Chip Resistor, 0 Ohm, 0.063 W, -55 to 155 degC, 0402 (1005 Metric)
footprint RESC1005X40X25LL05T10 (Chip Resistor, 2-Leads, Body 1.05x0.55mm, IPC High Density)
footprint RESC1005X40X25ML05T10 (Chip Resistor, 2-Leads, Body 1.05x0.55mm, IPC Low Density)
footprint RESC1005X40X25NL05T10 (Chip Resistor, 2-Leads, Body 1.05x0.55mm, IPC Medium Density)
pins: 1, 2
